# Altium schematic symbol library jlcpcb_2025_04_capacitors_extended_0402.schlib: 3594 symbols (part 19 of 20) (continued)
## UMK105B7221KVHF
designator C?  Capacitance: 220pF  (hidden comment: *)
Capacitor, Ceramic (MLCC), 220pF, ±10%, 50V, X7R, ±10%, SMD 0402; Manufacturer: Taiyo Yuden; Manufacturer Part Number: UMK105B7221KVHF; Package Size: 0402; JLCPCB Basic Part: No; JLCPCB Part Number: C650945; Supplier 1: LCSC; Category: Capacitors - MLCC; Supplier Part Number 1: C650945; Tolerance: ±10%; Voltage Rating: 50V; Temperature Coefficient: X7R; RoHS: Yes; ComponentLink1Description: Datasheet; ComponentLink1URL: https://wmsc.lcsc.com/wmsc/upload/file/pdf/v2/lcsc/2304140030_Taiyo-Yuden-UMK105B7221KVHF_C650945.pdf; ComponentLink2Description: JLCPCB Part URL; ComponentLink2URL: https://jlcpcb.com/partdetail/C650945; ComponentLink3Description: LCSC Part URL; ComponentLink3URL: https://lcsc.com/product-detail/Multilayer-Ceramic-Capacitors-MLCC---SMD-SMT_Taiyo-Yuden-Taiyo-Yuden-UMK105B7221KVHF_C650945.html
footprint CAP-0402 (0402 (1005M) Capacitor)
pins: 1, 2

## UMK105B7223KVHF
designator C?  Capacitance: 22nF  (hidden comment: *)
Capacitor, Ceramic (MLCC), 22nF, ±10%, 50V, X7R, ±10%, SMD 0402; Manufacturer: Taiyo Yuden; Manufacturer Part Number: UMK105B7223KVHF; Package Size: 0402; JLCPCB Basic Part: No; JLCPCB Part Number: C412456; Supplier 1: LCSC; Category: Capacitors - MLCC; Supplier Part Number 1: C412456; Tolerance: ±10%; Voltage Rating: 50V; Temperature Coefficient: X7R; RoHS: Yes; ComponentLink1Description: Datasheet; ComponentLink1URL: https://wmsc.lcsc.com/wmsc/upload/file/pdf/v2/lcsc/2211282230_Taiyo-Yuden-UMK105B7223KVHF_C412456.pdf; ComponentLink2Description: JLCPCB Part URL; ComponentLink2URL: https://jlcpcb.com/partdetail/C412456; ComponentLink3Description: LCSC Part URL; ComponentLink3URL: https://lcsc.com/product-detail/Multilayer-Ceramic-Capacitors-MLCC---SMD-SMT_Taiyo-Yuden-Taiyo-Yuden-UMK105B7223KVHF_C412456.html
footprint CAP-0402 (0402 (1005M) Capacitor)
pins: 1, 2

## UMK105B7332KVHF
designator C?  Capacitance: 3.3nF  (hidden comment: *)
Capacitor, Ceramic (MLCC), 3.3nF, ±10%, 50V, X7R, ±10%, SMD 0402; Manufacturer: Taiyo Yuden; Manufacturer Part Number: UMK105B7332KVHF; Package Size: 0402; JLCPCB Basic Part: No; JLCPCB Part Number: C386114; Supplier 1: LCSC; Category: Capacitors - MLCC; Supplier Part Number 1: C386114; Tolerance: ±10%; Voltage Rating: 50V; Temperature Coefficient: X7R; RoHS: Yes; ComponentLink1Description: Datasheet; ComponentLink1URL: https://wmsc.lcsc.com/wmsc/upload/file/pdf/v2/lcsc/2304140030_Taiyo-Yuden-UMK105B7332KVHF_C386114.pdf; ComponentLink2Description: JLCPCB Part URL; ComponentLink2URL: https://jlcpcb.com/partdetail/C386114; ComponentLink3Description: LCSC Part URL; ComponentLink3URL: https://lcsc.com/product-detail/Multilayer-Ceramic-Capacitors-MLCC---SMD-SMT_Taiyo-Yuden-Taiyo-Yuden-UMK105B7332KVHF_C386114.html
footprint CAP-0402 (0402 (1005M) Capacitor)
pins: 1, 2

## UMK105B7471KV-F
designator C?  Capacitance: 470pF  (hidden comment: *)
Capacitor, Ceramic (MLCC), 470pF, ±10%, 50V, X7R, ±10%, SMD 0402; Manufacturer: Taiyo Yuden; Manufacturer Part Number: UMK105B7471KV-F; Package Size: 0402; JLCPCB Basic Part: No; JLCPCB Part Number: C92840; Supplier 1: LCSC; Category: Capacitors - MLCC; Supplier Part Number 1: C92840; Tolerance: ±10%; Voltage Rating: 50V; Temperature Coefficient: X7R; RoHS: Yes; ComponentLink1Description: Datasheet; ComponentLink1URL: https://wmsc.lcsc.com/wmsc/upload/file/pdf/v2/lcsc/2211282300_Taiyo-Yuden-UMK105B7471KV-F_C92840.pdf; ComponentLink2Description: JLCPCB Part URL; ComponentLink2URL: https://jlcpcb.com/partdetail/C92840; ComponentLink3Description: LCSC Part URL; ComponentLink3URL: https://lcsc.com/product-detail/Multilayer-Ceramic-Capacitors-MLCC---SMD-SMT_Taiyo-Yuden-Taiyo-Yuden-UMK105B7471KV-F_C92840.html
footprint CAP-0402 (0402 (1005M) Capacitor)
pins: 1, 2

## UMK105B7471KVHF
designator C?  Capacitance: 470pF  (hidden comment: *)
Capacitor, Ceramic (MLCC), 470pF, ±10%, 50V, X7R, ±10%, SMD 0402; Manufacturer: Taiyo Yuden; Manufacturer Part Number: UMK105B7471KVHF; Package Size: 0402; JLCPCB Basic Part: No; JLCPCB Part Number: C412457; Supplier 1: LCSC; Category: Capacitors - MLCC; Supplier Part Number 1: C412457; Tolerance: ±10%; Voltage Rating: 50V; Temperature Coefficient: X7R; RoHS: Yes; ComponentLink1Description: Datasheet; ComponentLink1URL: https://wmsc.lcsc.com/wmsc/upload/file/pdf/v2/lcsc/2304140030_Taiyo-Yuden-UMK105B7471KVHF_C412457.pdf; ComponentLink2Description: JLCPCB Part URL; ComponentLink2URL: https://jlcpcb.com/partdetail/C412457; ComponentLink3Description: LCSC Part URL; ComponentLink3URL: https://lcsc.com/product-detail/Multilayer-Ceramic-Capacitors-MLCC---SMD-SMT_Taiyo-Yuden-Taiyo-Yuden-UMK105B7471KVHF_C412457.html
footprint CAP-0402 (0402 (1005M) Capacitor)
pins: 1, 2

## UMK105B7472KVHF
designator C?  Capacitance: 4.7nF  (hidden comment: *)
Capacitor, Ceramic (MLCC), 4.7nF, ±10%, 50V, X7R, ±10%, SMD 0402; Manufacturer: Taiyo Yuden; Manufacturer Part Number: UMK105B7472KVHF; Package Size: 0402; JLCPCB Basic Part: No; JLCPCB Part Number: C386115; Supplier 1: LCSC; Category: Capacitors - MLCC; Supplier Part Number 1: C386115; Tolerance: ±10%; Voltage Rating: 50V; Temperature Coefficient: X7R; RoHS: Yes; ComponentLink1Description: Datasheet; ComponentLink1URL: https://wmsc.lcsc.com/wmsc/upload/file/pdf/v2/lcsc/2304140030_Taiyo-Yuden-UMK105B7472KVHF_C386115.pdf; ComponentLink2Description: JLCPCB Part URL; ComponentLink2URL: https://jlcpcb.com/partdetail/C386115; ComponentLink3Description: LCSC Part URL; ComponentLink3URL: https://lcsc.com/product-detail/Multilayer-Ceramic-Capacitors-MLCC---SMD-SMT_Taiyo-Yuden-Taiyo-Yuden-UMK105B7472KVHF_C386115.html
footprint CAP-0402 (0402 (1005M) Capacitor)
pins: 1, 2

## UMK105B7473KVHF
designator C?  Capacitance: 47nF  (hidden comment: *)
Capacitor, Ceramic (MLCC), 47nF, ±10%, 50V, X7R, ±10%, SMD 0402; Manufacturer: Taiyo Yuden; Manufacturer Part Number: UMK105B7473KVHF; Package Size: 0402; JLCPCB Basic Part: No; JLCPCB Part Number: C386116; Supplier 1: LCSC; Category: Capacitors - MLCC; Supplier Part Number 1: C386116; Tolerance: ±10%; Voltage Rating: 50V; Temperature Coefficient: X7R; RoHS: Yes; ComponentLink1Description: Datasheet; ComponentLink1URL: https://wmsc.lcsc.com/wmsc/upload/file/pdf/v2/lcsc/2304140030_Taiyo-Yuden-UMK105B7473KVHF_C386116.pdf; ComponentLink2Description: JLCPCB Part URL; ComponentLink2URL: https://jlcpcb.com/partdetail/C386116; ComponentLink3Description: LCSC Part URL; ComponentLink3URL: https://lcsc.com/product-detail/Multilayer-Ceramic-Capacitors-MLCC---SMD-SMT_Taiyo-Yuden-Taiyo-Yuden-UMK105B7473KVHF_C386116.html
footprint CAP-0402 (0402 (1005M) Capacitor)
pins: 1, 2

## UMK105B7681KVHF
designator C?  Capacitance: 680pF  (hidden comment: *)
Capacitor, Ceramic (MLCC), 680pF, ±10%, 50V, X7R, ±10%, SMD 0402; Manufacturer: Taiyo Yuden; Manufacturer Part Number: UMK105B7681KVHF; Package Size: 0402; JLCPCB Basic Part: No; JLCPCB Part Number: C650943; Supplier 1: LCSC; Category: Capacitors - MLCC; Supplier Part Number 1: C650943; Tolerance: ±10%; Voltage Rating: 50V; Temperature Coefficient: X7R; RoHS: Yes; ComponentLink1Description: Datasheet; ComponentLink1URL: https://wmsc.lcsc.com/wmsc/upload/file/pdf/v2/lcsc/2304140030_Taiyo-Yuden-UMK105B7681KVHF_C650943.pdf; ComponentLink2Description: JLCPCB Part URL; ComponentLink2URL: https://jlcpcb.com/partdetail/C650943; ComponentLink3Description: LCSC Part URL; ComponentLink3URL: https://lcsc.com/product-detail/Multilayer-Ceramic-Capacitors-MLCC---SMD-SMT_Taiyo-Yuden-Taiyo-Yuden-UMK105B7681KVHF_C650943.html
footprint CAP-0402 (0402 (1005M) Capacitor)
pins: 1, 2

## UMK105B7682KVHF
designator C?  Capacitance: 6.8nF  (hidden comment: *)
Capacitor, Ceramic (MLCC), 6.8nF, ±10%, 50V, X7R, ±10%, SMD 0402; Manufacturer: Taiyo Yuden; Manufacturer Part Number: UMK105B7682KVHF; Package Size: 0402; JLCPCB Basic Part: No; JLCPCB Part Number: C2185901; Supplier 1: LCSC; Category: Capacitors - MLCC; Supplier Part Number 1: C2185901; Tolerance: ±10%; Voltage Rating: 50V; Temperature Coefficient: X7R; RoHS: Yes; ComponentLink1Description: Datasheet; ComponentLink1URL: https://wmsc.lcsc.com/wmsc/upload/file/pdf/v2/lcsc/2211282000_Taiyo-Yuden-UMK105B7682KVHF_C2185901.pdf; ComponentLink2Description: JLCPCB Part URL; ComponentLink2URL: https://jlcpcb.com/partdetail/C2185901; ComponentLink3Description: LCSC Part URL; ComponentLink3URL: https://lcsc.com/product-detail/Multilayer-Ceramic-Capacitors-MLCC---SMD-SMT_Taiyo-Yuden-Taiyo-Yuden-UMK105B7682KVHF_C2185901.html
footprint CAP-0402 (0402 (1005M) Capacitor)
pins: 1, 2

## UMK105BJ102KV-F
designator C?  Capacitance: 1nF  (hidden comment: *)
Capacitor, Ceramic (MLCC), 1nF, ±10%, 50V, X5R, ±10%, SMD 0402; Manufacturer: Taiyo Yuden; Manufacturer Part Number: UMK105BJ102KV-F; Package Size: 0402; JLCPCB Basic Part: No; JLCPCB Part Number: C92841; Supplier 1: LCSC; Category: Capacitors - MLCC; Supplier Part Number 1: C92841; Tolerance: ±10%; Voltage Rating: 50V; Temperature Coefficient: X5R; RoHS: Yes; ComponentLink1Description: Datasheet; ComponentLink1URL: https://wmsc.lcsc.com/wmsc/upload/file/pdf/v2/lcsc/1810171713_Taiyo-Yuden-UMK105BJ102KV-F_C92841.pdf; ComponentLink2Description: JLCPCB Part URL; ComponentLink2URL: https://jlcpcb.com/partdetail/C92841; ComponentLink3Description: LCSC Part URL; ComponentLink3URL: https://lcsc.com/product-detail/Multilayer-Ceramic-Capacitors-MLCC---SMD-SMT_Taiyo-Yuden-Taiyo-Yuden-UMK105BJ102KV-F_C92841.html
footprint CAP-0402 (0402 (1005M) Capacitor)
pins: 1, 2

## UMK105BJ104KV-F
designator C?  Capacitance: 100nF  (hidden comment: *)
Capacitor, Ceramic (MLCC), 100nF, ±10%, 50V, X5R, ±10%, SMD 0402; Manufacturer: Taiyo Yuden; Manufacturer Part Number: UMK105BJ104KV-F; Package Size: 0402; JLCPCB Basic Part: No; JLCPCB Part Number: C386117; Supplier 1: LCSC; Category: Capacitors - MLCC; Supplier Part Number 1: C386117; Tolerance: ±10%; Voltage Rating: 50V; Temperature Coefficient: X5R; RoHS: Yes; ComponentLink1Description: Datasheet; ComponentLink1URL: https://wmsc.lcsc.com/wmsc/upload/file/pdf/v2/lcsc/2304140030_Taiyo-Yuden-UMK105BJ104KV-F_C386117.pdf; ComponentLink2Description: JLCPCB Part URL; ComponentLink2URL: https://jlcpcb.com/partdetail/C386117; ComponentLink3Description: LCSC Part URL; ComponentLink3URL: https://lcsc.com/product-detail/Multilayer-Ceramic-Capacitors-MLCC---SMD-SMT_Taiyo-Yuden-Taiyo-Yuden-UMK105BJ104KV-F_C386117.html
footprint CAP-0402 (0402 (1005M) Capacitor)
pins: 1, 2

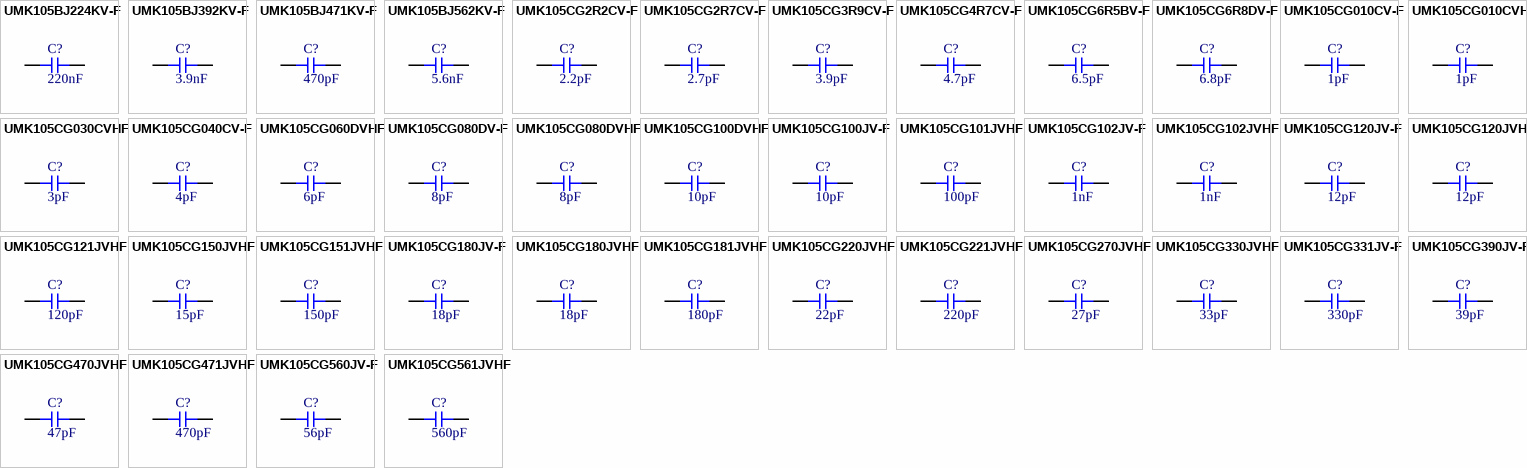
[diagram p86: symbols UMK105BJ224KV-F to UMK105CG561JVHF]

## UMK105BJ224KV-F
designator C?  Capacitance: 220nF  (hidden comment: *)
Capacitor, Ceramic (MLCC), 220nF, ±10%, 50V, X5R, ±10%, SMD 0402; Manufacturer: Taiyo Yuden; Manufacturer Part Number: UMK105BJ224KV-F; Package Size: 0402; JLCPCB Basic Part: No; JLCPCB Part Number: C268018; Supplier 1: LCSC; Category: Capacitors - MLCC; Supplier Part Number 1: C268018; Tolerance: ±10%; Voltage Rating: 50V; Temperature Coefficient: X5R; RoHS: Yes; ComponentLink1Description: Datasheet; ComponentLink1URL: https://wmsc.lcsc.com/wmsc/upload/file/pdf/v2/lcsc/2108160930_Taiyo-Yuden-UMK105BJ224KV-F_C268018.pdf; ComponentLink2Description: JLCPCB Part URL; ComponentLink2URL: https://jlcpcb.com/partdetail/C268018; ComponentLink3Description: LCSC Part URL; ComponentLink3URL: https://lcsc.com/product-detail/Multilayer-Ceramic-Capacitors-MLCC---SMD-SMT_Taiyo-Yuden-Taiyo-Yuden-UMK105BJ224KV-F_C268018.html
footprint CAP-0402 (0402 (1005M) Capacitor)
pins: 1, 2

## UMK105BJ392KV-F
designator C?  Capacitance: 3.9nF  (hidden comment: *)
Capacitor, Ceramic (MLCC), 3.9nF, ±10%, 50V, X5R, ±10%, SMD 0402; Manufacturer: Taiyo Yuden; Manufacturer Part Number: UMK105BJ392KV-F; Package Size: 0402; JLCPCB Basic Part: No; JLCPCB Part Number: C311702; Supplier 1: LCSC; Category: Capacitors - MLCC; Supplier Part Number 1: C311702; Tolerance: ±10%; Voltage Rating: 50V; Temperature Coefficient: X5R; RoHS: Yes; ComponentLink1Description: Datasheet; ComponentLink1URL: https://wmsc.lcsc.com/wmsc/upload/file/pdf/v2/lcsc/2304140030_Taiyo-Yuden-UMK105BJ392KV-F_C311702.pdf; ComponentLink2Description: JLCPCB Part URL; ComponentLink2URL: https://jlcpcb.com/partdetail/C311702; ComponentLink3Description: LCSC Part URL; ComponentLink3URL: https://lcsc.com/product-detail/Multilayer-Ceramic-Capacitors-MLCC---SMD-SMT_Taiyo-Yuden-Taiyo-Yuden-UMK105BJ392KV-F_C311702.html
footprint CAP-0402 (0402 (1005M) Capacitor)
pins: 1, 2

## UMK105BJ471KV-F
designator C?  Capacitance: 470pF  (hidden comment: *)
Capacitor, Ceramic (MLCC), 470pF, ±10%, 50V, X5R, ±10%, SMD 0402; Manufacturer: Taiyo Yuden; Manufacturer Part Number: UMK105BJ471KV-F; Package Size: 0402; JLCPCB Basic Part: No; JLCPCB Part Number: C524947; Supplier 1: LCSC; Category: Capacitors - MLCC; Supplier Part Number 1: C524947; Tolerance: ±10%; Voltage Rating: 50V; Temperature Coefficient: X5R; RoHS: Yes; ComponentLink1Description: Datasheet; ComponentLink1URL: https://wmsc.lcsc.com/wmsc/upload/file/pdf/v2/lcsc/2304140030_Taiyo-Yuden-UMK105BJ471KV-F_C524947.pdf; ComponentLink2Description: JLCPCB Part URL; ComponentLink2URL: https://jlcpcb.com/partdetail/C524947; ComponentLink3Description: LCSC Part URL; ComponentLink3URL: https://lcsc.com/product-detail/Multilayer-Ceramic-Capacitors-MLCC---SMD-SMT_Taiyo-Yuden-Taiyo-Yuden-UMK105BJ471KV-F_C524947.html
footprint CAP-0402 (0402 (1005M) Capacitor)
pins: 1, 2

## UMK105BJ562KV-F
designator C?  Capacitance: 5.6nF  (hidden comment: *)
Capacitor, Ceramic (MLCC), 5.6nF, ±10%, 50V, X5R, ±10%, SMD 0402; Manufacturer: Taiyo Yuden; Manufacturer Part Number: UMK105BJ562KV-F; Package Size: 0402; JLCPCB Basic Part: No; JLCPCB Part Number: C311703; Supplier 1: LCSC; Category: Capacitors - MLCC; Supplier Part Number 1: C311703; Tolerance: ±10%; Voltage Rating: 50V; Temperature Coefficient: X5R; RoHS: Yes; ComponentLink1Description: Datasheet; ComponentLink1URL: https://wmsc.lcsc.com/wmsc/upload/file/pdf/v2/lcsc/2304140030_Taiyo-Yuden-UMK105BJ562KV-F_C311703.pdf; ComponentLink2Description: JLCPCB Part URL; ComponentLink2URL: https://jlcpcb.com/partdetail/C311703; ComponentLink3Description: LCSC Part URL; ComponentLink3URL: https://lcsc.com/product-detail/Multilayer-Ceramic-Capacitors-MLCC---SMD-SMT_Taiyo-Yuden-Taiyo-Yuden-UMK105BJ562KV-F_C311703.html
footprint CAP-0402 (0402 (1005M) Capacitor)
pins: 1, 2

## UMK105CG2R2CV-F
designator C?  Capacitance: 2.2pF  (hidden comment: *)
Capacitor, Ceramic (MLCC), 2.2pF, 50V, C0G, SMD 0402; Manufacturer: Taiyo Yuden; Manufacturer Part Number: UMK105CG2R2CV-F; Package Size: 0402; JLCPCB Basic Part: No; JLCPCB Part Number: C386135; Supplier 1: LCSC; Category: Capacitors - MLCC; Supplier Part Number 1: C386135; Voltage Rating: 50V; Temperature Coefficient: C0G; RoHS: Yes; ComponentLink1Description: Datasheet; ComponentLink1URL: https://wmsc.lcsc.com/wmsc/upload/file/pdf/v2/lcsc/2304140030_Taiyo-Yuden-UMK105CG2R2CV-F_C386135.pdf; ComponentLink2Description: JLCPCB Part URL; ComponentLink2URL: https://jlcpcb.com/partdetail/C386135; ComponentLink3Description: LCSC Part URL; ComponentLink3URL: https://lcsc.com/product-detail/Multilayer-Ceramic-Capacitors-MLCC---SMD-SMT_Taiyo-Yuden-Taiyo-Yuden-UMK105CG2R2CV-F_C386135.html
footprint CAP-0402 (0402 (1005M) Capacitor)
pins: 1, 2

## UMK105CG2R7CV-F
designator C?  Capacitance: 2.7pF  (hidden comment: *)
Capacitor, Ceramic (MLCC), 2.7pF, 50V, C0G, SMD 0402; Manufacturer: Taiyo Yuden; Manufacturer Part Number: UMK105CG2R7CV-F; Package Size: 0402; JLCPCB Basic Part: No; JLCPCB Part Number: C386137; Supplier 1: LCSC; Category: Capacitors - MLCC; Supplier Part Number 1: C386137; Voltage Rating: 50V; Temperature Coefficient: C0G; RoHS: Yes; ComponentLink1Description: Datasheet; ComponentLink1URL: https://wmsc.lcsc.com/wmsc/upload/file/pdf/v2/lcsc/2304140030_Taiyo-Yuden-UMK105CG2R7CV-F_C386137.pdf; ComponentLink2Description: JLCPCB Part URL; ComponentLink2URL: https://jlcpcb.com/partdetail/C386137; ComponentLink3Description: LCSC Part URL; ComponentLink3URL: https://lcsc.com/product-detail/Multilayer-Ceramic-Capacitors-MLCC---SMD-SMT_Taiyo-Yuden-Taiyo-Yuden-UMK105CG2R7CV-F_C386137.html
footprint CAP-0402 (0402 (1005M) Capacitor)
pins: 1, 2

## UMK105CG3R9CV-F
designator C?  Capacitance: 3.9pF  (hidden comment: *)
Capacitor, Ceramic (MLCC), 3.9pF, 50V, C0G, SMD 0402; Manufacturer: Taiyo Yuden; Manufacturer Part Number: UMK105CG3R9CV-F; Package Size: 0402; JLCPCB Basic Part: No; JLCPCB Part Number: C386141; Supplier 1: LCSC; Category: Capacitors - MLCC; Supplier Part Number 1: C386141; Voltage Rating: 50V; Temperature Coefficient: C0G; RoHS: Yes; ComponentLink1Description: Datasheet; ComponentLink1URL: https://wmsc.lcsc.com/wmsc/upload/file/pdf/v2/lcsc/2304140030_Taiyo-Yuden-UMK105CG3R9CV-F_C386141.pdf; ComponentLink2Description: JLCPCB Part URL; ComponentLink2URL: https://jlcpcb.com/partdetail/C386141; ComponentLink3Description: LCSC Part URL; ComponentLink3URL: https://lcsc.com/product-detail/Multilayer-Ceramic-Capacitors-MLCC---SMD-SMT_Taiyo-Yuden-Taiyo-Yuden-UMK105CG3R9CV-F_C386141.html
footprint CAP-0402 (0402 (1005M) Capacitor)
pins: 1, 2

## UMK105CG4R7CV-F
designator C?  Capacitance: 4.7pF  (hidden comment: *)
Capacitor, Ceramic (MLCC), 4.7pF, 50V, C0G, SMD 0402; Manufacturer: Taiyo Yuden; Manufacturer Part Number: UMK105CG4R7CV-F; Package Size: 0402; JLCPCB Basic Part: No; JLCPCB Part Number: C311706; Supplier 1: LCSC; Category: Capacitors - MLCC; Supplier Part Number 1: C311706; Voltage Rating: 50V; Temperature Coefficient: C0G; RoHS: Yes; ComponentLink1Description: Datasheet; ComponentLink1URL: https://wmsc.lcsc.com/wmsc/upload/file/pdf/v2/lcsc/2304140030_Taiyo-Yuden-UMK105CG4R7CV-F_C311706.pdf; ComponentLink2Description: JLCPCB Part URL; ComponentLink2URL: https://jlcpcb.com/partdetail/C311706; ComponentLink3Description: LCSC Part URL; ComponentLink3URL: https://lcsc.com/product-detail/Multilayer-Ceramic-Capacitors-MLCC---SMD-SMT_Taiyo-Yuden-Taiyo-Yuden-UMK105CG4R7CV-F_C311706.html
footprint CAP-0402 (0402 (1005M) Capacitor)
pins: 1, 2

## UMK105CG6R5BV-F
designator C?  Capacitance: 6.5pF  (hidden comment: *)
Capacitor, Ceramic (MLCC), 6.5pF, 50V, C0G, SMD 0402; Manufacturer: Taiyo Yuden; Manufacturer Part Number: UMK105CG6R5BV-F; Package Size: 0402; JLCPCB Basic Part: No; JLCPCB Part Number: C311707; Supplier 1: LCSC; Category: Capacitors - MLCC; Supplier Part Number 1: C311707; Voltage Rating: 50V; Temperature Coefficient: C0G; RoHS: Yes; ComponentLink1Description: Datasheet; ComponentLink1URL: https://wmsc.lcsc.com/wmsc/upload/file/pdf/v2/lcsc/2304140030_Taiyo-Yuden-UMK105CG6R5BV-F_C311707.pdf; ComponentLink2Description: JLCPCB Part URL; ComponentLink2URL: https://jlcpcb.com/partdetail/C311707; ComponentLink3Description: LCSC Part URL; ComponentLink3URL: https://lcsc.com/product-detail/Multilayer-Ceramic-Capacitors-MLCC---SMD-SMT_Taiyo-Yuden-Taiyo-Yuden-UMK105CG6R5BV-F_C311707.html
footprint CAP-0402 (0402 (1005M) Capacitor)
pins: 1, 2

## UMK105CG6R8DV-F
designator C?  Capacitance: 6.8pF  (hidden comment: *)
Capacitor, Ceramic (MLCC), 6.8pF, 50V, C0G, SMD 0402; Manufacturer: Taiyo Yuden; Manufacturer Part Number: UMK105CG6R8DV-F; Package Size: 0402; JLCPCB Basic Part: No; JLCPCB Part Number: C386146; Supplier 1: LCSC; Category: Capacitors - MLCC; Supplier Part Number 1: C386146; Voltage Rating: 50V; Temperature Coefficient: C0G; RoHS: Yes; ComponentLink1Description: Datasheet; ComponentLink1URL: https://wmsc.lcsc.com/wmsc/upload/file/pdf/v2/lcsc/2304140030_Taiyo-Yuden-UMK105CG6R8DV-F_C386146.pdf; ComponentLink2Description: JLCPCB Part URL; ComponentLink2URL: https://jlcpcb.com/partdetail/C386146; ComponentLink3Description: LCSC Part URL; ComponentLink3URL: https://lcsc.com/product-detail/Multilayer-Ceramic-Capacitors-MLCC---SMD-SMT_Taiyo-Yuden-Taiyo-Yuden-UMK105CG6R8DV-F_C386146.html
footprint CAP-0402 (0402 (1005M) Capacitor)
pins: 1, 2

## UMK105CG010CV-F
designator C?  Capacitance: 1pF  (hidden comment: *)
Capacitor, Ceramic (MLCC), 1pF, 50V, C0G, SMD 0402; Manufacturer: Taiyo Yuden; Manufacturer Part Number: UMK105CG010CV-F; Package Size: 0402; JLCPCB Basic Part: No; JLCPCB Part Number: C386118; Supplier 1: LCSC; Category: Capacitors - MLCC; Supplier Part Number 1: C386118; Voltage Rating: 50V; Temperature Coefficient: C0G; RoHS: Yes; ComponentLink1Description: Datasheet; ComponentLink1URL: https://wmsc.lcsc.com/wmsc/upload/file/pdf/v2/lcsc/2304140030_Taiyo-Yuden-UMK105CG010CV-F_C386118.pdf; ComponentLink2Description: JLCPCB Part URL; ComponentLink2URL: https://jlcpcb.com/partdetail/C386118; ComponentLink3Description: LCSC Part URL; ComponentLink3URL: https://lcsc.com/product-detail/Multilayer-Ceramic-Capacitors-MLCC---SMD-SMT_Taiyo-Yuden-Taiyo-Yuden-UMK105CG010CV-F_C386118.html
footprint CAP-0402 (0402 (1005M) Capacitor)
pins: 1, 2

## UMK105CG010CVHF
designator C?  Capacitance: 1pF  (hidden comment: *)
Capacitor, Ceramic (MLCC), 1pF, 50V, C0G, SMD 0402; Manufacturer: Taiyo Yuden; Manufacturer Part Number: UMK105CG010CVHF; Package Size: 0402; JLCPCB Basic Part: No; JLCPCB Part Number: C1845624; Supplier 1: LCSC; Category: Capacitors - MLCC; Supplier Part Number 1: C1845624; Voltage Rating: 50V; Temperature Coefficient: C0G; RoHS: Yes; ComponentLink1Description: Datasheet; ComponentLink1URL: https://wmsc.lcsc.com/wmsc/upload/file/pdf/v2/lcsc/2108160930_Taiyo-Yuden-UMK105CG010CVHF_C1845624.pdf; ComponentLink2Description: JLCPCB Part URL; ComponentLink2URL: https://jlcpcb.com/partdetail/C1845624; ComponentLink3Description: LCSC Part URL; ComponentLink3URL: https://lcsc.com/product-detail/Multilayer-Ceramic-Capacitors-MLCC---SMD-SMT_Taiyo-Yuden-Taiyo-Yuden-UMK105CG010CVHF_C1845624.html
footprint CAP-0402 (0402 (1005M) Capacitor)
pins: 1, 2

## UMK105CG030CVHF
designator C?  Capacitance: 3pF  (hidden comment: *)
Capacitor, Ceramic (MLCC), 3pF, 50V, C0G, SMD 0402; Manufacturer: Taiyo Yuden; Manufacturer Part Number: UMK105CG030CVHF; Package Size: 0402; JLCPCB Basic Part: No; JLCPCB Part Number: C386120; Supplier 1: LCSC; Category: Capacitors - MLCC; Supplier Part Number 1: C386120; Voltage Rating: 50V; Temperature Coefficient: C0G; RoHS: Yes; ComponentLink1Description: Datasheet; ComponentLink1URL: https://wmsc.lcsc.com/wmsc/upload/file/pdf/v2/lcsc/1912111437_Taiyo-Yuden-UMK105CG030CVHF_C386120.pdf; ComponentLink2Description: JLCPCB Part URL; ComponentLink2URL: https://jlcpcb.com/partdetail/C386120; ComponentLink3Description: LCSC Part URL; ComponentLink3URL: https://lcsc.com/product-detail/Multilayer-Ceramic-Capacitors-MLCC---SMD-SMT_Taiyo-Yuden-Taiyo-Yuden-UMK105CG030CVHF_C386120.html
footprint CAP-0402 (0402 (1005M) Capacitor)
pins: 1, 2

## UMK105CG040CV-F
designator C?  Capacitance: 4pF  (hidden comment: *)
Capacitor, Ceramic (MLCC), 4pF, 50V, C0G, SMD 0402; Manufacturer: Taiyo Yuden; Manufacturer Part Number: UMK105CG040CV-F; Package Size: 0402; JLCPCB Basic Part: No; JLCPCB Part Number: C386121; Supplier 1: LCSC; Category: Capacitors - MLCC; Supplier Part Number 1: C386121; Voltage Rating: 50V; Temperature Coefficient: C0G; RoHS: Yes; ComponentLink1Description: Datasheet; ComponentLink1URL: https://wmsc.lcsc.com/wmsc/upload/file/pdf/v2/lcsc/2304140030_Taiyo-Yuden-UMK105CG040CV-F_C386121.pdf; ComponentLink2Description: JLCPCB Part URL; ComponentLink2URL: https://jlcpcb.com/partdetail/C386121; ComponentLink3Description: LCSC Part URL; ComponentLink3URL: https://lcsc.com/product-detail/Multilayer-Ceramic-Capacitors-MLCC---SMD-SMT_Taiyo-Yuden-Taiyo-Yuden-UMK105CG040CV-F_C386121.html
footprint CAP-0402 (0402 (1005M) Capacitor)
pins: 1, 2

## UMK105CG060DVHF
designator C?  Capacitance: 6pF  (hidden comment: *)
Capacitor, Ceramic (MLCC), 6pF, 50V, C0G, SMD 0402; Manufacturer: Taiyo Yuden; Manufacturer Part Number: UMK105CG060DVHF; Package Size: 0402; JLCPCB Basic Part: No; JLCPCB Part Number: C2180827; Supplier 1: LCSC; Category: Capacitors - MLCC; Supplier Part Number 1: C2180827; Voltage Rating: 50V; Temperature Coefficient: C0G; RoHS: Yes; ComponentLink1Description: Datasheet; ComponentLink1URL: https://wmsc.lcsc.com/wmsc/upload/file/pdf/v2/lcsc/2309051400_Taiyo-Yuden-UMK105CG060DVHF_C2180827.pdf; ComponentLink2Description: JLCPCB Part URL; ComponentLink2URL: https://jlcpcb.com/partdetail/C2180827; ComponentLink3Description: LCSC Part URL; ComponentLink3URL: https://lcsc.com/product-detail/Multilayer-Ceramic-Capacitors-MLCC---SMD-SMT_Taiyo-Yuden-Taiyo-Yuden-UMK105CG060DVHF_C2180827.html
footprint CAP-0402 (0402 (1005M) Capacitor)
pins: 1, 2

## UMK105CG080DV-F
designator C?  Capacitance: 8pF  (hidden comment: *)
Capacitor, Ceramic (MLCC), 8pF, 50V, C0G, SMD 0402; Manufacturer: Taiyo Yuden; Manufacturer Part Number: UMK105CG080DV-F; Package Size: 0402; JLCPCB Basic Part: No; JLCPCB Part Number: C386122; Supplier 1: LCSC; Category: Capacitors - MLCC; Supplier Part Number 1: C386122; Voltage Rating: 50V; Temperature Coefficient: C0G; RoHS: Yes; ComponentLink1Description: Datasheet; ComponentLink1URL: https://wmsc.lcsc.com/wmsc/upload/file/pdf/v2/lcsc/2304140030_Taiyo-Yuden-UMK105CG080DV-F_C386122.pdf; ComponentLink2Description: JLCPCB Part URL; ComponentLink2URL: https://jlcpcb.com/partdetail/C386122; ComponentLink3Description: LCSC Part URL; ComponentLink3URL: https://lcsc.com/product-detail/Multilayer-Ceramic-Capacitors-MLCC---SMD-SMT_Taiyo-Yuden-Taiyo-Yuden-UMK105CG080DV-F_C386122.html
footprint CAP-0402 (0402 (1005M) Capacitor)
pins: 1, 2

## UMK105CG080DVHF
designator C?  Capacitance: 8pF  (hidden comment: *)
Capacitor, Ceramic (MLCC), 8pF, 50V, C0G, SMD 0402; Manufacturer: Taiyo Yuden; Manufacturer Part Number: UMK105CG080DVHF; Package Size: 0402; JLCPCB Basic Part: No; JLCPCB Part Number: C412458; Supplier 1: LCSC; Category: Capacitors - MLCC; Supplier Part Number 1: C412458; Voltage Rating: 50V; Temperature Coefficient: C0G; RoHS: Yes; ComponentLink1Description: Datasheet; ComponentLink1URL: https://wmsc.lcsc.com/wmsc/upload/file/pdf/v2/lcsc/2304140030_Taiyo-Yuden-UMK105CG080DVHF_C412458.pdf; ComponentLink2Description: JLCPCB Part URL; ComponentLink2URL: https://jlcpcb.com/partdetail/C412458; ComponentLink3Description: LCSC Part URL; ComponentLink3URL: https://lcsc.com/product-detail/Multilayer-Ceramic-Capacitors-MLCC---SMD-SMT_Taiyo-Yuden-Taiyo-Yuden-UMK105CG080DVHF_C412458.html
footprint CAP-0402 (0402 (1005M) Capacitor)
pins: 1, 2

## UMK105CG100DVHF
designator C?  Capacitance: 10pF  (hidden comment: *)
Capacitor, Ceramic (MLCC), 10pF, 50V, C0G, SMD 0402; Manufacturer: Taiyo Yuden; Manufacturer Part Number: UMK105CG100DVHF; Package Size: 0402; JLCPCB Basic Part: No; JLCPCB Part Number: C650948; Supplier 1: LCSC; Category: Capacitors - MLCC; Supplier Part Number 1: C650948; Voltage Rating: 50V; Temperature Coefficient: C0G; RoHS: Yes; ComponentLink1Description: Datasheet; ComponentLink1URL: https://wmsc.lcsc.com/wmsc/upload/file/pdf/v2/lcsc/2304140030_Taiyo-Yuden-UMK105CG100DVHF_C650948.pdf; ComponentLink2Description: JLCPCB Part URL; ComponentLink2URL: https://jlcpcb.com/partdetail/C650948; ComponentLink3Description: LCSC Part URL; ComponentLink3URL: https://lcsc.com/product-detail/Multilayer-Ceramic-Capacitors-MLCC---SMD-SMT_Taiyo-Yuden-Taiyo-Yuden-UMK105CG100DVHF_C650948.html
footprint CAP-0402 (0402 (1005M) Capacitor)
pins: 1, 2

## UMK105CG100JV-F
designator C?  Capacitance: 10pF  (hidden comment: *)
Capacitor, Ceramic (MLCC), 10pF, ±5%, 50V, C0G, ±5%, SMD 0402; Manufacturer: Taiyo Yuden; Manufacturer Part Number: UMK105CG100JV-F; Package Size: 0402; JLCPCB Basic Part: No; JLCPCB Part Number: C268017; Supplier 1: LCSC; Category: Capacitors - MLCC; Supplier Part Number 1: C268017; Tolerance: ±5%; Voltage Rating: 50V; Temperature Coefficient: C0G; RoHS: Yes; ComponentLink1Description: Datasheet; ComponentLink1URL: https://wmsc.lcsc.com/wmsc/upload/file/pdf/v2/lcsc/2304140030_Taiyo-Yuden-UMK105CG100JV-F_C268017.pdf; ComponentLink2Description: JLCPCB Part URL; ComponentLink2URL: https://jlcpcb.com/partdetail/C268017; ComponentLink3Description: LCSC Part URL; ComponentLink3URL: https://lcsc.com/product-detail/Multilayer-Ceramic-Capacitors-MLCC---SMD-SMT_Taiyo-Yuden-Taiyo-Yuden-UMK105CG100JV-F_C268017.html
footprint CAP-0402 (0402 (1005M) Capacitor)
pins: 1, 2

## UMK105CG101JVHF
designator C?  Capacitance: 100pF  (hidden comment: *)
Capacitor, Ceramic (MLCC), 100pF, ±5%, 50V, C0G, ±5%, SMD 0402; Manufacturer: Taiyo Yuden; Manufacturer Part Number: UMK105CG101JVHF; Package Size: 0402; JLCPCB Basic Part: No; JLCPCB Part Number: C386124; Supplier 1: LCSC; Category: Capacitors - MLCC; Supplier Part Number 1: C386124; Tolerance: ±5%; Voltage Rating: 50V; Temperature Coefficient: C0G; RoHS: Yes; ComponentLink1Description: Datasheet; ComponentLink1URL: https://wmsc.lcsc.com/wmsc/upload/file/pdf/v2/lcsc/2304140030_Taiyo-Yuden-UMK105CG101JVHF_C386124.pdf; ComponentLink2Description: JLCPCB Part URL; ComponentLink2URL: https://jlcpcb.com/partdetail/C386124; ComponentLink3Description: LCSC Part URL; ComponentLink3URL: https://lcsc.com/product-detail/Multilayer-Ceramic-Capacitors-MLCC---SMD-SMT_Taiyo-Yuden-Taiyo-Yuden-UMK105CG101JVHF_C386124.html
footprint CAP-0402 (0402 (1005M) Capacitor)
pins: 1, 2

## UMK105CG102JV-F
designator C?  Capacitance: 1nF  (hidden comment: *)
Capacitor, Ceramic (MLCC), 1nF, ±5%, 50V, C0G, ±5%, SMD 0402; Manufacturer: Taiyo Yuden; Manufacturer Part Number: UMK105CG102JV-F; Package Size: 0402; JLCPCB Basic Part: No; JLCPCB Part Number: C386125; Supplier 1: LCSC; Category: Capacitors - MLCC; Supplier Part Number 1: C386125; Tolerance: ±5%; Voltage Rating: 50V; Temperature Coefficient: C0G; RoHS: Yes; ComponentLink1Description: Datasheet; ComponentLink1URL: https://wmsc.lcsc.com/wmsc/upload/file/pdf/v2/lcsc/2304140030_Taiyo-Yuden-UMK105CG102JV-F_C386125.pdf; ComponentLink2Description: JLCPCB Part URL; ComponentLink2URL: https://jlcpcb.com/partdetail/C386125; ComponentLink3Description: LCSC Part URL; ComponentLink3URL: https://lcsc.com/product-detail/Multilayer-Ceramic-Capacitors-MLCC---SMD-SMT_Taiyo-Yuden-Taiyo-Yuden-UMK105CG102JV-F_C386125.html
footprint CAP-0402 (0402 (1005M) Capacitor)
pins: 1, 2

## UMK105CG102JVHF
designator C?  Capacitance: 1nF  (hidden comment: *)
Capacitor, Ceramic (MLCC), 1nF, ±5%, 50V, C0G, ±5%, SMD 0402; Manufacturer: Taiyo Yuden; Manufacturer Part Number: UMK105CG102JVHF; Package Size: 0402; JLCPCB Basic Part: No; JLCPCB Part Number: C650981; Supplier 1: LCSC; Category: Capacitors - MLCC; Supplier Part Number 1: C650981; Tolerance: ±5%; Voltage Rating: 50V; Temperature Coefficient: C0G; RoHS: Yes; ComponentLink1Description: Datasheet; ComponentLink1URL: https://wmsc.lcsc.com/wmsc/upload/file/pdf/v2/lcsc/2304140030_Taiyo-Yuden-UMK105CG102JVHF_C650981.pdf; ComponentLink2Description: JLCPCB Part URL; ComponentLink2URL: https://jlcpcb.com/partdetail/C650981; ComponentLink3Description: LCSC Part URL; ComponentLink3URL: https://lcsc.com/product-detail/Multilayer-Ceramic-Capacitors-MLCC---SMD-SMT_Taiyo-Yuden-Taiyo-Yuden-UMK105CG102JVHF_C650981.html
footprint CAP-0402 (0402 (1005M) Capacitor)
pins: 1, 2

## UMK105CG120JV-F
designator C?  Capacitance: 12pF  (hidden comment: *)
Capacitor, Ceramic (MLCC), 12pF, ±5%, 50V, C0G, ±5%, SMD 0402; Manufacturer: Taiyo Yuden; Manufacturer Part Number: UMK105CG120JV-F; Package Size: 0402; JLCPCB Basic Part: No; JLCPCB Part Number: C92842; Supplier 1: LCSC; Category: Capacitors - MLCC; Supplier Part Number 1: C92842; Tolerance: ±5%; Voltage Rating: 50V; Temperature Coefficient: C0G; RoHS: Yes; ComponentLink1Description: Datasheet; ComponentLink1URL: https://wmsc.lcsc.com/wmsc/upload/file/pdf/v2/lcsc/1810171713_Taiyo-Yuden-UMK105CG120JV-F_C92842.pdf; ComponentLink2Description: JLCPCB Part URL; ComponentLink2URL: https://jlcpcb.com/partdetail/C92842; ComponentLink3Description: LCSC Part URL; ComponentLink3URL: https://lcsc.com/product-detail/Multilayer-Ceramic-Capacitors-MLCC---SMD-SMT_Taiyo-Yuden-Taiyo-Yuden-UMK105CG120JV-F_C92842.html
footprint CAP-0402 (0402 (1005M) Capacitor)
pins: 1, 2

## UMK105CG120JVHF
designator C?  Capacitance: 12pF  (hidden comment: *)
Capacitor, Ceramic (MLCC), 12pF, ±5%, 50V, C0G, ±5%, SMD 0402; Manufacturer: Taiyo Yuden; Manufacturer Part Number: UMK105CG120JVHF; Package Size: 0402; JLCPCB Basic Part: No; JLCPCB Part Number: C386126; Supplier 1: LCSC; Category: Capacitors - MLCC; Supplier Part Number 1: C386126; Tolerance: ±5%; Voltage Rating: 50V; Temperature Coefficient: C0G; RoHS: Yes; ComponentLink1Description: Datasheet; ComponentLink1URL: https://wmsc.lcsc.com/wmsc/upload/file/pdf/v2/lcsc/2304140030_Taiyo-Yuden-UMK105CG120JVHF_C386126.pdf; ComponentLink2Description: JLCPCB Part URL; ComponentLink2URL: https://jlcpcb.com/partdetail/C386126; ComponentLink3Description: LCSC Part URL; ComponentLink3URL: https://lcsc.com/product-detail/Multilayer-Ceramic-Capacitors-MLCC---SMD-SMT_Taiyo-Yuden-Taiyo-Yuden-UMK105CG120JVHF_C386126.html
footprint CAP-0402 (0402 (1005M) Capacitor)
pins: 1, 2

## UMK105CG121JVHF
designator C?  Capacitance: 120pF  (hidden comment: *)
Capacitor, Ceramic (MLCC), 120pF, ±5%, 50V, ±5%, SMD 0402; Manufacturer: Taiyo Yuden; Manufacturer Part Number: UMK105CG121JVHF; Package Size: 0402; JLCPCB Basic Part: No; JLCPCB Part Number: C2686249; Supplier 1: LCSC; Category: Capacitors - MLCC; Supplier Part Number 1: C2686249; Tolerance: ±5%; Voltage Rating: 50V; RoHS: Yes; ComponentLink1Description: Datasheet; ComponentLink1URL: https://wmsc.lcsc.com/wmsc/upload/file/pdf/v2/lcsc/2106070205_Taiyo-Yuden-UMK105CG121JVHF_C2686249.pdf; ComponentLink2Description: JLCPCB Part URL; ComponentLink2URL: https://jlcpcb.com/partdetail/C2686249; ComponentLink3Description: LCSC Part URL; ComponentLink3URL: https://lcsc.com/product-detail/Multilayer-Ceramic-Capacitors-MLCC---SMD-SMT_Taiyo-Yuden-Taiyo-Yuden-UMK105CG121JVHF_C2686249.html
footprint CAP-0402 (0402 (1005M) Capacitor)
pins: 1, 2

## UMK105CG150JVHF
designator C?  Capacitance: 15pF  (hidden comment: *)
Capacitor, Ceramic (MLCC), 15pF, ±5%, 50V, C0G, ±5%, SMD 0402; Manufacturer: Taiyo Yuden; Manufacturer Part Number: UMK105CG150JVHF; Package Size: 0402; JLCPCB Basic Part: No; JLCPCB Part Number: C2880416; Supplier 1: LCSC; Category: Capacitors - MLCC; Supplier Part Number 1: C2880416; Tolerance: ±5%; Voltage Rating: 50V; Temperature Coefficient: C0G; RoHS: Yes; ComponentLink1Description: Datasheet; ComponentLink1URL: https://wmsc.lcsc.com/wmsc/upload/file/pdf/v2/lcsc/2108160930_Taiyo-Yuden-UMK105CG150JVHF_C2880416.pdf; ComponentLink2Description: JLCPCB Part URL; ComponentLink2URL: https://jlcpcb.com/partdetail/C2880416; ComponentLink3Description: LCSC Part URL; ComponentLink3URL: https://lcsc.com/product-detail/Multilayer-Ceramic-Capacitors-MLCC---SMD-SMT_Taiyo-Yuden-Taiyo-Yuden-UMK105CG150JVHF_C2880416.html
footprint CAP-0402 (0402 (1005M) Capacitor)
pins: 1, 2

## UMK105CG151JVHF
designator C?  Capacitance: 150pF  (hidden comment: *)
Capacitor, Ceramic (MLCC), 150pF, ±5%, 50V, C0G, ±5%, SMD 0402; Manufacturer: Taiyo Yuden; Manufacturer Part Number: UMK105CG151JVHF; Package Size: 0402; JLCPCB Basic Part: No; JLCPCB Part Number: C412459; Supplier 1: LCSC; Category: Capacitors - MLCC; Supplier Part Number 1: C412459; Tolerance: ±5%; Voltage Rating: 50V; Temperature Coefficient: C0G; RoHS: Yes; ComponentLink1Description: Datasheet; ComponentLink1URL: https://wmsc.lcsc.com/wmsc/upload/file/pdf/v2/lcsc/2304140030_Taiyo-Yuden-UMK105CG151JVHF_C412459.pdf; ComponentLink2Description: JLCPCB Part URL; ComponentLink2URL: https://jlcpcb.com/partdetail/C412459; ComponentLink3Description: LCSC Part URL; ComponentLink3URL: https://lcsc.com/product-detail/Multilayer-Ceramic-Capacitors-MLCC---SMD-SMT_Taiyo-Yuden-Taiyo-Yuden-UMK105CG151JVHF_C412459.html
footprint CAP-0402 (0402 (1005M) Capacitor)
pins: 1, 2

## UMK105CG180JV-F
designator C?  Capacitance: 18pF  (hidden comment: *)
Capacitor, Ceramic (MLCC), 18pF, ±5%, 50V, C0G, ±5%, SMD 0402; Manufacturer: Taiyo Yuden; Manufacturer Part Number: UMK105CG180JV-F; Package Size: 0402; JLCPCB Basic Part: No; JLCPCB Part Number: C386129; Supplier 1: LCSC; Category: Capacitors - MLCC; Supplier Part Number 1: C386129; Tolerance: ±5%; Voltage Rating: 50V; Temperature Coefficient: C0G; RoHS: Yes; ComponentLink1Description: Datasheet; ComponentLink1URL: https://wmsc.lcsc.com/wmsc/upload/file/pdf/v2/lcsc/2304140030_Taiyo-Yuden-UMK105CG180JV-F_C386129.pdf; ComponentLink2Description: JLCPCB Part URL; ComponentLink2URL: https://jlcpcb.com/partdetail/C386129; ComponentLink3Description: LCSC Part URL; ComponentLink3URL: https://lcsc.com/product-detail/Multilayer-Ceramic-Capacitors-MLCC---SMD-SMT_Taiyo-Yuden-Taiyo-Yuden-UMK105CG180JV-F_C386129.html
footprint CAP-0402 (0402 (1005M) Capacitor)
pins: 1, 2

## UMK105CG180JVHF
designator C?  Capacitance: 18pF  (hidden comment: *)
Capacitor, Ceramic (MLCC), 18pF, ±5%, 50V, C0G, ±5%, SMD 0402; Manufacturer: Taiyo Yuden; Manufacturer Part Number: UMK105CG180JVHF; Package Size: 0402; JLCPCB Basic Part: No; JLCPCB Part Number: C2175838; Supplier 1: LCSC; Category: Capacitors - MLCC; Supplier Part Number 1: C2175838; Tolerance: ±5%; Voltage Rating: 50V; Temperature Coefficient: C0G; RoHS: Yes; ComponentLink1Description: Datasheet; ComponentLink1URL: https://wmsc.lcsc.com/wmsc/upload/file/pdf/v2/lcsc/2309051422_Taiyo-Yuden-UMK105CG180JVHF_C2175838.pdf; ComponentLink2Description: JLCPCB Part URL; ComponentLink2URL: https://jlcpcb.com/partdetail/C2175838; ComponentLink3Description: LCSC Part URL; ComponentLink3URL: https://lcsc.com/product-detail/Multilayer-Ceramic-Capacitors-MLCC---SMD-SMT_Taiyo-Yuden-Taiyo-Yuden-UMK105CG180JVHF_C2175838.html
footprint CAP-0402 (0402 (1005M) Capacitor)
pins: 1, 2

## UMK105CG181JVHF
designator C?  Capacitance: 180pF  (hidden comment: *)
Capacitor, Ceramic (MLCC), 180pF, ±5%, 50V, C0G, ±5%, SMD 0402; Manufacturer: Taiyo Yuden; Manufacturer Part Number: UMK105CG181JVHF; Package Size: 0402; JLCPCB Basic Part: No; JLCPCB Part Number: C412460; Supplier 1: LCSC; Category: Capacitors - MLCC; Supplier Part Number 1: C412460; Tolerance: ±5%; Voltage Rating: 50V; Temperature Coefficient: C0G; RoHS: Yes; ComponentLink1Description: Datasheet; ComponentLink1URL: https://wmsc.lcsc.com/wmsc/upload/file/pdf/v2/lcsc/2304140030_Taiyo-Yuden-UMK105CG181JVHF_C412460.pdf; ComponentLink2Description: JLCPCB Part URL; ComponentLink2URL: https://jlcpcb.com/partdetail/C412460; ComponentLink3Description: LCSC Part URL; ComponentLink3URL: https://lcsc.com/product-detail/Multilayer-Ceramic-Capacitors-MLCC---SMD-SMT_Taiyo-Yuden-Taiyo-Yuden-UMK105CG181JVHF_C412460.html
footprint CAP-0402 (0402 (1005M) Capacitor)
pins: 1, 2

## UMK105CG220JVHF
designator C?  Capacitance: 22pF  (hidden comment: *)
Capacitor, Ceramic (MLCC), 22pF, ±5%, 50V, C0G, ±5%, SMD 0402; Manufacturer: Taiyo Yuden; Manufacturer Part Number: UMK105CG220JVHF; Package Size: 0402; JLCPCB Basic Part: No; JLCPCB Part Number: C650997; Supplier 1: LCSC; Category: Capacitors - MLCC; Supplier Part Number 1: C650997; Tolerance: ±5%; Voltage Rating: 50V; Temperature Coefficient: C0G; RoHS: Yes; ComponentLink1Description: Datasheet; ComponentLink1URL: https://wmsc.lcsc.com/wmsc/upload/file/pdf/v2/lcsc/2304140030_Taiyo-Yuden-UMK105CG220JVHF_C650997.pdf; ComponentLink2Description: JLCPCB Part URL; ComponentLink2URL: https://jlcpcb.com/partdetail/C650997; ComponentLink3Description: LCSC Part URL; ComponentLink3URL: https://lcsc.com/product-detail/Multilayer-Ceramic-Capacitors-MLCC---SMD-SMT_Taiyo-Yuden-Taiyo-Yuden-UMK105CG220JVHF_C650997.html
footprint CAP-0402 (0402 (1005M) Capacitor)
pins: 1, 2

## UMK105CG221JVHF
designator C?  Capacitance: 220pF  (hidden comment: *)
Capacitor, Ceramic (MLCC), 220pF, ±5%, 50V, C0G, ±5%, SMD 0402; Manufacturer: Taiyo Yuden; Manufacturer Part Number: UMK105CG221JVHF; Package Size: 0402; JLCPCB Basic Part: No; JLCPCB Part Number: C412611; Supplier 1: LCSC; Category: Capacitors - MLCC; Supplier Part Number 1: C412611; Tolerance: ±5%; Voltage Rating: 50V; Temperature Coefficient: C0G; RoHS: Yes; ComponentLink1Description: Datasheet; ComponentLink1URL: https://wmsc.lcsc.com/wmsc/upload/file/pdf/v2/lcsc/2304140030_Taiyo-Yuden-UMK105CG221JVHF_C412611.pdf; ComponentLink2Description: JLCPCB Part URL; ComponentLink2URL: https://jlcpcb.com/partdetail/C412611; ComponentLink3Description: LCSC Part URL; ComponentLink3URL: https://lcsc.com/product-detail/Multilayer-Ceramic-Capacitors-MLCC---SMD-SMT_Taiyo-Yuden-Taiyo-Yuden-UMK105CG221JVHF_C412611.html
footprint CAP-0402 (0402 (1005M) Capacitor)
pins: 1, 2

## UMK105CG270JVHF
designator C?  Capacitance: 27pF  (hidden comment: *)
Capacitor, Ceramic (MLCC), 27pF, ±5%, 50V, C0G, ±5%, SMD 0402; Manufacturer: Taiyo Yuden; Manufacturer Part Number: UMK105CG270JVHF; Package Size: 0402; JLCPCB Basic Part: No; JLCPCB Part Number: C386134; Supplier 1: LCSC; Category: Capacitors - MLCC; Supplier Part Number 1: C386134; Tolerance: ±5%; Voltage Rating: 50V; Temperature Coefficient: C0G; RoHS: Yes; ComponentLink1Description: Datasheet; ComponentLink1URL: https://wmsc.lcsc.com/wmsc/upload/file/pdf/v2/lcsc/2304140030_Taiyo-Yuden-UMK105CG270JVHF_C386134.pdf; ComponentLink2Description: JLCPCB Part URL; ComponentLink2URL: https://jlcpcb.com/partdetail/C386134; ComponentLink3Description: LCSC Part URL; ComponentLink3URL: https://lcsc.com/product-detail/Multilayer-Ceramic-Capacitors-MLCC---SMD-SMT_Taiyo-Yuden-Taiyo-Yuden-UMK105CG270JVHF_C386134.html
footprint CAP-0402 (0402 (1005M) Capacitor)
pins: 1, 2

## UMK105CG330JVHF
designator C?  Capacitance: 33pF  (hidden comment: *)
Capacitor, Ceramic (MLCC), 33pF, ±5%, 50V, C0G, ±5%, SMD 0402; Manufacturer: Taiyo Yuden; Manufacturer Part Number: UMK105CG330JVHF; Package Size: 0402; JLCPCB Basic Part: No; JLCPCB Part Number: C650990; Supplier 1: LCSC; Category: Capacitors - MLCC; Supplier Part Number 1: C650990; Tolerance: ±5%; Voltage Rating: 50V; Temperature Coefficient: C0G; RoHS: Yes; ComponentLink1Description: Datasheet; ComponentLink1URL: https://wmsc.lcsc.com/wmsc/upload/file/pdf/v2/lcsc/2304140030_Taiyo-Yuden-UMK105CG330JVHF_C650990.pdf; ComponentLink2Description: JLCPCB Part URL; ComponentLink2URL: https://jlcpcb.com/partdetail/C650990; ComponentLink3Description: LCSC Part URL; ComponentLink3URL: https://lcsc.com/product-detail/Multilayer-Ceramic-Capacitors-MLCC---SMD-SMT_Taiyo-Yuden-Taiyo-Yuden-UMK105CG330JVHF_C650990.html
footprint CAP-0402 (0402 (1005M) Capacitor)
pins: 1, 2

## UMK105CG331JV-F
designator C?  Capacitance: 330pF  (hidden comment: *)
Capacitor, Ceramic (MLCC), 330pF, ±5%, 50V, C0G, ±5%, SMD 0402; Manufacturer: Taiyo Yuden; Manufacturer Part Number: UMK105CG331JV-F; Package Size: 0402; JLCPCB Basic Part: No; JLCPCB Part Number: C386138; Supplier 1: LCSC; Category: Capacitors - MLCC; Supplier Part Number 1: C386138; Tolerance: ±5%; Voltage Rating: 50V; Temperature Coefficient: C0G; RoHS: Yes; ComponentLink1Description: Datasheet; ComponentLink1URL: https://wmsc.lcsc.com/wmsc/upload/file/pdf/v2/lcsc/1912111437_Taiyo-Yuden-UMK105CG331JV-F_C386138.pdf; ComponentLink2Description: JLCPCB Part URL; ComponentLink2URL: https://jlcpcb.com/partdetail/C386138; ComponentLink3Description: LCSC Part URL; ComponentLink3URL: https://lcsc.com/product-detail/Multilayer-Ceramic-Capacitors-MLCC---SMD-SMT_Taiyo-Yuden-Taiyo-Yuden-UMK105CG331JV-F_C386138.html
footprint CAP-0402 (0402 (1005M) Capacitor)
pins: 1, 2

## UMK105CG390JV-F
designator C?  Capacitance: 39pF  (hidden comment: *)
Capacitor, Ceramic (MLCC), 39pF, ±5%, 50V, C0G, ±5%, SMD 0402; Manufacturer: Taiyo Yuden; Manufacturer Part Number: UMK105CG390JV-F; Package Size: 0402; JLCPCB Basic Part: No; JLCPCB Part Number: C386139; Supplier 1: LCSC; Category: Capacitors - MLCC; Supplier Part Number 1: C386139; Tolerance: ±5%; Voltage Rating: 50V; Temperature Coefficient: C0G; RoHS: Yes; ComponentLink1Description: Datasheet; ComponentLink1URL: https://wmsc.lcsc.com/wmsc/upload/file/pdf/v2/lcsc/1912111437_Taiyo-Yuden-UMK105CG390JV-F_C386139.pdf; ComponentLink2Description: JLCPCB Part URL; ComponentLink2URL: https://jlcpcb.com/partdetail/C386139; ComponentLink3Description: LCSC Part URL; ComponentLink3URL: https://lcsc.com/product-detail/Multilayer-Ceramic-Capacitors-MLCC---SMD-SMT_Taiyo-Yuden-Taiyo-Yuden-UMK105CG390JV-F_C386139.html
footprint CAP-0402 (0402 (1005M) Capacitor)
pins: 1, 2

## UMK105CG470JVHF
designator C?  Capacitance: 47pF  (hidden comment: *)
Capacitor, Ceramic (MLCC), 47pF, ±5%, 50V, C0G, ±5%, SMD 0402; Manufacturer: Taiyo Yuden; Manufacturer Part Number: UMK105CG470JVHF; Package Size: 0402; JLCPCB Basic Part: No; JLCPCB Part Number: C2176014; Supplier 1: LCSC; Category: Capacitors - MLCC; Supplier Part Number 1: C2176014; Tolerance: ±5%; Voltage Rating: 50V; Temperature Coefficient: C0G; RoHS: Yes; ComponentLink1Description: Datasheet; ComponentLink1URL: https://wmsc.lcsc.com/wmsc/upload/file/pdf/v2/lcsc/2309051422_Taiyo-Yuden-UMK105CG470JVHF_C2176014.pdf; ComponentLink2Description: JLCPCB Part URL; ComponentLink2URL: https://jlcpcb.com/partdetail/C2176014; ComponentLink3Description: LCSC Part URL; ComponentLink3URL: https://lcsc.com/product-detail/Multilayer-Ceramic-Capacitors-MLCC---SMD-SMT_Taiyo-Yuden-Taiyo-Yuden-UMK105CG470JVHF_C2176014.html
footprint CAP-0402 (0402 (1005M) Capacitor)
pins: 1, 2
